# Altium footprint library Miscellaneous THD.PcbLib: 216 footprints (part 1 of 15) (continued)
## APPOINTECH_FD13R0S1STXS-4BX (Preliminary) [mm] "1310nm FP Laser Diode SM Module (Sugar Cube ST Receptacle)"
height 10.28
pads (8):
  round 1.4 hole 0.7: 1(-1.27,3.81) 2(-1.27,1.27) 3(-1.27,-1.27) 4(-1.27,-3.81) 5(1.27,-3.81) 6(1.27,-1.27) 7(1.27,1.27) 8(1.27,3.81)
Top Overlay:
  circle w0.3: c-3.81,5.08 r0.15
  lines w0.2: 7.62,-4.25 8.12,-4.75 ; 7.62,4.25 8.12,4.75 ; 12.62,-3.525 24.72,-3.525 ; 12.62,3.525 24.72,3.525 ; 19.52,-3.525 19.52,-4.1 20.92,-4.1 20.92,-3.525 ; 19.52,3.525 19.52,4.1 20.92,4.1 20.92,3.525 ; 24.72,-0.6 18.52,-0.6 cw(c18.52,0) 18.52,0.6 24.72,0.6 ; 8.12,-4.75 8.62,-4.25 ; 8.12,-4.75 8.12,4.75 ; 8.12,4.75 8.62,4.25 ; 8.62,-4.25 9.12,-4.75 ; 8.62,-4.25 8.62,4.25 ; 8.62,4.25 9.12,4.75 ; 9.12,-4.75 9.62,-4.25 ; 9.12,-4.75 9.12,4.75 ; 9.12,4.75 9.62,4.25 ; 9.62,-4.25 10.12,-4.75 ; 9.62,-4.25 9.62,4.25 ; 9.62,4.25 10.12,4.75 ; 10.12,-4.75 10.62,-4.25 ; 10.12,-4.75 10.12,4.75 ; 10.12,4.75 10.62,4.25 ; 10.62,-4.25 11.12,-4.75 ; 10.62,-4.25 10.62,4.25 ; 10.62,4.25 11.12,4.75 ; 11.12,-4.75 11.62,-4.25 ; 11.12,-4.75 11.12,4.75 ; 11.12,4.75 11.62,4.25 ; 11.62,-4.25 12.12,-4.75 ; 11.62,-4.25 11.62,4.25 ; 11.62,4.25 12.12,4.75 ; 12.12,-4.75 12.62,-4.25 12.62,4.25 12.12,4.75 ; 12.12,-4.75 12.12,4.75 ; 24.72,-3.525 24.72,3.525 ; 24.72,-3.525 24.72,3.525 ; -5.08,-6.35 -5.08,6.35 7.62,6.35 7.62,-6.35 -5.08,-6.35
  text "Preliminary Drawing" at -4.1,-5.9 h1.2
  text "To be approved" at -1.9,-6.5 h1.2
Mechanical 8:
  lines w0.1: -2.27,-3.81 -1.27,-3.81 ; -2.27,-1.27 -1.27,-1.27 ; -2.27,1.27 -1.27,1.27 ; -2.27,3.81 -1.27,3.81 ; -1.27,-4.81 -1.27,-3.81 ; -1.27,-2.81 -1.27,-3.81 ; -1.27,-2.27 -1.27,-1.27 ; -1.27,-0.27 -1.27,-1.27 ; -1.27,0.27 -1.27,1.27 ; -1.27,2.27 -1.27,1.27 ; -1.27,2.81 -1.27,3.81 ; -1.27,4.81 -1.27,3.81 ; -1,0 0,0 ; -0.27,-3.81 -1.27,-3.81 ; -0.27,-1.27 -1.27,-1.27 ; -0.27,1.27 -1.27,1.27 ; -0.27,3.81 -1.27,3.81 ; 0,-1 0,0 ; 0,1 0,0 ; 0.27,-3.81 1.27,-3.81 ; 0.27,-1.27 1.27,-1.27 ; 0.27,1.27 1.27,1.27 ; 0.27,3.81 1.27,3.81 ; 1,0 0,0 ; 1.27,-4.81 1.27,-3.81 ; 1.27,-2.81 1.27,-3.81 ; 1.27,-2.27 1.27,-1.27 ; 1.27,-0.27 1.27,-1.27 ; 1.27,0.27 1.27,1.27 ; 1.27,2.27 1.27,1.27 ; 1.27,2.81 1.27,3.81 ; 1.27,4.81 1.27,3.81 ; 2.27,-3.81 1.27,-3.81 ; 2.27,-1.27 1.27,-1.27 ; 2.27,1.27 1.27,1.27 ; 2.27,3.81 1.27,3.81
Mechanical 14:
  circle w0.3: c-3.81,5.08 r0.15
  lines w0.1: 7.62,-4.25 8.12,-4.75 ; 7.62,4.25 8.12,4.75 ; 12.62,-3.525 24.72,-3.525 24.72,3.525 12.62,3.525 ; 19.52,-3.525 19.52,-4.1 20.92,-4.1 20.92,-3.525 ; 19.52,3.525 19.52,4.1 20.92,4.1 20.92,3.525 ; 24.72,-0.6 18.52,-0.6 cw(c18.52,0) 18.52,0.6 24.72,0.6 ; 8.12,-4.75 8.62,-4.25 ; 8.12,-4.75 8.12,4.75 ; 8.12,4.75 8.62,4.25 ; 8.62,-4.25 9.12,-4.75 ; 8.62,-4.25 8.62,4.25 ; 8.62,4.25 9.12,4.75 ; 9.12,-4.75 9.62,-4.25 ; 9.12,-4.75 9.12,4.75 ; 9.12,4.75 9.62,4.25 ; 9.62,-4.25 10.12,-4.75 ; 9.62,-4.25 9.62,4.25 ; 9.62,4.25 10.12,4.75 ; 10.12,-4.75 10.62,-4.25 ; 10.12,-4.75 10.12,4.75 ; 10.12,4.75 10.62,4.25 ; 10.62,-4.25 11.12,-4.75 ; 10.62,-4.25 10.62,4.25 ; 10.62,4.25 11.12,4.75 ; 11.12,-4.75 11.62,-4.25 ; 11.12,-4.75 11.12,4.75 ; 11.12,4.75 11.62,4.25 ; 11.62,-4.25 12.12,-4.75 ; 11.62,-4.25 11.62,4.25 ; 11.62,4.25 12.12,4.75 ; 12.12,-4.75 12.62,-4.25 12.62,4.25 12.12,4.75 ; 12.12,-4.75 12.12,4.75 ; -5.08,-6.15 ccw(c-4.88,-6.15) -4.88,-6.35 7.42,-6.35 ccw(c7.42,-6.15) 7.62,-6.15 7.62,6.15 ccw(c7.42,6.15) 7.42,6.35 -4.88,6.35 ccw(c-4.88,6.15) -5.08,6.15 -5.08,-6.15
3D body "APPOINTECH_FD13R0S1STXS-4BX.stp": height 10.2, standoff -3.6, extent -5.08,-6.35 24.72,6.35

## ASSMANN_A-31-S1/SILVER [mm] "DIN 41617, Pitch 2.5mm, 31 Contacts Right-Angled Male Connector"
height 8.5
pads (33):
  round 2 hole 1.3: 1(0,0) 2(-2.5,-2.5) 3(0,-5) 4(-2.5,-7.5) 5(0,-10) 6(-2.5,-12.5) 7(0,-15) 8(-2.5,-17.5) 9(0,-20) 10(-2.5,-22.5) 11(0,-25) 12(-2.5,-27.5) 13(0,-30) 14(-2.5,-32.5) 15(0,-35) 16(-2.5,-37.5) 17(0,-40) 18(-2.5,-42.5) 19(0,-45) 20(-2.5,-47.5) 21(0,-50) 22(-2.5,-52.5) 23(0,-55) 24(-2.5,-57.5) 25(0,-60) 26(-2.5,-62.5) 27(0,-65) 28(-2.5,-67.5) 29(0,-70) 30(-2.5,-72.5) 31(0,-75)
  round 3.5 / inner round 3.5 / far side round 5.1 hole 2.8: MTG1(2.5,5) MTG2(2.5,-80)
Top Overlay:
  lines w0.2: 0.916,-77 -1.1,-78.86 ; 2,-76 -1.1,-78.86 ; 2,1 -1.1,3.86 -1.1,7.8 7,7.8 7,-82.8 -1.1,-82.8 -1.1,-78.86 ; 7,-77 2,-77 2,2 7,2
Mechanical 8:
  lines w0.1: -3,-72.5 -2.5,-72.5 ; -3,-67.5 -2.5,-67.5 ; -3,-62.5 -2.5,-62.5 ; -3,-57.5 -2.5,-57.5 ; -3,-52.5 -2.5,-52.5 ; -3,-47.5 -2.5,-47.5 ; -3,-42.5 -2.5,-42.5 ; -3,-37.5 -2.5,-37.5 ; -3,-32.5 -2.5,-32.5 ; -3,-27.5 -2.5,-27.5 ; -3,-22.5 -2.5,-22.5 ; -3,-17.5 -2.5,-17.5 ; -3,-12.5 -2.5,-12.5 ; -3,-7.5 -2.5,-7.5 ; -3,-2.5 -2.5,-2.5 ; -2.5,-73 -2.5,-72.5 ; -2.5,-72 -2.5,-72.5 ; -2.5,-68 -2.5,-67.5 ; -2.5,-67 -2.5,-67.5 ; -2.5,-63 -2.5,-62.5 ; -2.5,-62 -2.5,-62.5 ; -2.5,-58 -2.5,-57.5 ; -2.5,-57 -2.5,-57.5 ; -2.5,-53 -2.5,-52.5 ; -2.5,-52 -2.5,-52.5 ; -2.5,-48 -2.5,-47.5 ; -2.5,-47 -2.5,-47.5 ; -2.5,-43 -2.5,-42.5 ; -2.5,-42 -2.5,-42.5 ; -2.5,-38 -2.5,-37.5 ; -2.5,-37 -2.5,-37.5 ; -2.5,-33 -2.5,-32.5 ; -2.5,-32 -2.5,-32.5 ; -2.5,-28 -2.5,-27.5 ; -2.5,-27 -2.5,-27.5 ; -2.5,-23 -2.5,-22.5 ; -2.5,-22 -2.5,-22.5 ; -2.5,-18 -2.5,-17.5 ; -2.5,-17 -2.5,-17.5 ; -2.5,-13 -2.5,-12.5 ; -2.5,-12 -2.5,-12.5 ; -2.5,-8 -2.5,-7.5 ; -2.5,-7 -2.5,-7.5 ; -2.5,-3 -2.5,-2.5 ; -2.5,-2 -2.5,-2.5 ; -2,-72.5 -2.5,-72.5 ; -2,-67.5 -2.5,-67.5 ; -2,-62.5 -2.5,-62.5 ; -2,-57.5 -2.5,-57.5 ; -2,-52.5 -2.5,-52.5 ; -2,-47.5 -2.5,-47.5 ; -2,-42.5 -2.5,-42.5 ; -2,-37.5 -2.5,-37.5 ; -2,-32.5 -2.5,-32.5 ; -2,-27.5 -2.5,-27.5 ; -2,-22.5 -2.5,-22.5 ; -2,-17.5 -2.5,-17.5 ; -2,-12.5 -2.5,-12.5 ; -2,-7.5 -2.5,-7.5 ; -2,-2.5 -2.5,-2.5 ; -0.5,-75 0,-75 ; -0.5,-70 0,-70 ; -0.5,-65 0,-65 ; -0.5,-60 0,-60 ; -0.5,-55 0,-55 ; -0.5,-50 0,-50 ; -0.5,-45 0,-45 ; -0.5,-40 0,-40 ; -0.5,-35 0,-35 ; -0.5,-30 0,-30 ; -0.5,-25 0,-25 ; -0.5,-20 0,-20 ; -0.5,-15 0,-15 ; -0.5,-10 0,-10 ; -0.5,-5 0,-5 ; -0.5,0 0,0 ; 0,-75.5 0,-75 ; 0,-74.5 0,-75 ; 0,-70.5 0,-70 ; 0,-69.5 0,-70 ; 0,-65.5 0,-65 ; 0,-64.5 0,-65 ; 0,-60.5 0,-60 ; 0,-59.5 0,-60 ; 0,-55.5 0,-55 ; 0,-54.5 0,-55 ; 0,-50.5 0,-50 ; 0,-49.5 0,-50 ; 0,-45.5 0,-45 ; 0,-44.5 0,-45 ; 0,-40.5 0,-40 ; 0,-39.5 0,-40 ; 0,-35.5 0,-35 ; 0,-34.5 0,-35 ; 0,-30.5 0,-30 ; 0,-29.5 0,-30 ; 0,-25.5 0,-25 ; 0,-24.5 0,-25 ; 0,-20.5 0,-20 ; 0,-19.5 0,-20 ; 0,-15.5 0,-15 ; 0,-14.5 0,-15 ; 0,-10.5 0,-10 ; 0,-9.5 0,-10 ; 0,-5.5 0,-5 ; 0,-4.5 0,-5 ; 0,-0.5 0,0 ; 0,0.5 0,0 ; 0.5,-75 0,-75 ; 0.5,-70 0,-70 ; 0.5,-65 0,-65 ; 0.5,-60 0,-60 ; 0.5,-55 0,-55 ; 0.5,-50 0,-50 ; 0.5,-45 0,-45 ; 0.5,-40 0,-40 ; 0.5,-35 0,-35 ; 0.5,-30 0,-30 ; 0.5,-25 0,-25 ; 0.5,-20 0,-20 ; 0.5,-15 0,-15 ; 0.5,-10 0,-10 ; 0.5,-5 0,-5 ; 0.5,0 0,0 ; 2,-80 2.5,-80 ; 2,5 2.5,5 ; 2.5,-80.5 2.5,-80 ; 2.5,-79.5 2.5,-80 ; 2.5,4.5 2.5,5 ; 2.5,5.5 2.5,5 ; 3,-80 2.5,-80 ; 3,5 2.5,5
Mechanical 14:
  lines w0.1: 0.916,-77 -1.1,-78.86 ; 2,-76 -1.1,-78.86 ; 2,1 -1.1,3.86 -1.1,7.8 7,7.8 7,-82.8 -1.1,-82.8 -1.1,-78.86 ; 7,-77 2,-77 2,2 7,2 ; 1.1,-80.775 ccw(c2.5,-80) 3.9,-80.775 3.9,-79.225 ccw(c2.5,-80) 1.1,-79.225 1.1,-80.775 ; 1.1,4.225 ccw(c2.5,5) 3.9,4.225 3.9,5.775 ccw(c2.5,5) 1.1,5.775 1.1,4.225
3D body "ASSMANN_A-31-S1-SILVER.stp": height 8.5, standoff -3.3, extent -3,-82.8 14.2,7.8

## ASSMANN_A-31-S2-SILVER_a [mm] "DIN 41617, Pitch 2.5mm, 31 Solder cups Contacts Right-Angled Female Connector"
height 10
Top Overlay:
  drawing of 230 lines, arcs and shapes, not listed
Mechanical 8:
  lines w0.1: -6.45,-42.5 -4,-42.5 -1.55,-42.5 ; -6.45,42.5 -4,42.5 -1.55,42.5 ; -0.5,0 0,0 ; 0,-0.5 0,0 ; 0,0.5 0,0 ; 0.5,0 0,0
Mechanical 14:
  drawing of 230 lines, arcs and shapes, not listed
3D body "ASSMANN_A-31-S2-SILVER_a.stp": height 9, standoff -1, extent -8,-45.4 5,45.4

## AUGAT_LSG-2FG1-1 [mm] "Single Lead Socket - Wire-Wrap Termination"
height 7.7
pads (1):
  round 1.9 / inner round 1.5 / far side round 1.5 hole 0.9: 1(0,0)
Top Overlay:
  circle w0.2: c0,0 r1.2
Mechanical 14:
  circle w0.1: c0,0 r1.08
Mechanical 15:
  circle w0.05: c0,0 r1.205
3D body "AUGAT_LSG-2FG1-1.stp": height 7.72, standoff -12.93, extent -1.079,-1.079 1.08,1.08

## AVX_10 8478 064 001 025 [mm] "DIN 41612, Type Q, Thru-Hole Press-Fit Terminations; Rows a+b, 64 Position, Performance level 2, Lead 5.3mm, Straight Male Connector"
height 11.48
pads (66):
  round 1.7 hole 1: a1(0,0) a2(0,-2.54) a3(0,-5.08) a4(0,-7.62) a5(0,-10.16) a6(0,-12.7) a7(0,-15.24) a8(0,-17.78) a9(0,-20.32) a10(0,-22.86) a11(0,-25.4) a12(0,-27.94) a13(0,-30.48) a14(0,-33.02) a15(0,-35.56) a16(0,-38.1) a17(0,-40.64) a18(0,-43.18) a19(0,-45.72) a20(0,-48.26) a21(0,-50.8) a22(0,-53.34) a23(0,-55.88) a24(0,-58.42) a25(0,-60.96) a26(0,-63.5) a27(0,-66.04) a28(0,-68.58) a29(0,-71.12) a30(0,-73.66) a31(0,-76.2) a32(0,-78.74) b1(2.54,0) b2(2.54,-2.54) b3(2.54,-5.08) b4(2.54,-7.62) b5(2.54,-10.16) b6(2.54,-12.7) b7(2.54,-15.24) b8(2.54,-17.78) b9(2.54,-20.32) b10(2.54,-22.86) b11(2.54,-25.4) b12(2.54,-27.94) b13(2.54,-30.48) b14(2.54,-33.02) b15(2.54,-35.56) b16(2.54,-38.1) b17(2.54,-40.64) b18(2.54,-43.18) b19(2.54,-45.72) b20(2.54,-48.26) b21(2.54,-50.8) b22(2.54,-53.34) b23(2.54,-55.88) b24(2.54,-58.42) b25(2.54,-60.96) b26(2.54,-63.5) b27(2.54,-66.04) b28(2.54,-68.58) b29(2.54,-71.12) b30(2.54,-73.66) b31(2.54,-76.2) b32(2.54,-78.74)
  round 3.5 / inner round 3.5 / far side round 5.1 hole 2.8: MTG1(2.24,5.63) MTG2(2.24,-84.37)
Top Overlay:
  lines w0.2: -1.83,-83.32 -1.83,-86.87 5.57,-86.87 5.57,8.13 -1.83,8.13 -1.83,4.58 ; -1.83,-81.97 0.576,-81.97 ; -0.81,-86.87 -0.81,-84.37 0.749,-81.67 5.02,-81.67 ; -0.81,8.13 -0.81,5.63 0.749,2.93 5.02,2.93 ; -0.204,-83.32 -3.03,-83.32 -3.03,4.58 -0.204,4.58 ; 0.2,-82.62 -2.48,-82.62 ; 0.2,3.88 -2.48,3.88 ; 1.97,-81.02 4.37,-81.02 4.37,2.28 1.97,2.28 1.97,2.93 ; 2.62,-81.67 1.52,-80.57 ; 2.62,2.93 1.52,1.83 ; 3.731,-81.67 4.684,-83.32 5.57,-83.323 ; 3.731,2.93 4.684,4.58 5.57,4.58 ; -2.48,-82.62 -1.38,-81.52 ; -2.48,-82.62 -2.48,3.88 ; -2.48,3.88 -1.38,2.78 ; -1.38,-81.52 1.52,-81.52 1.52,-80.57 ; -1.38,-81.52 -1.38,2.78 ; -1.38,2.78 1.52,2.78 1.52,1.83 ; 1.52,-80.57 3.92,-80.57 ; 1.52,1.83 3.92,1.83 ; 3.92,-80.57 5.02,-81.67 ; 3.92,-80.57 3.92,1.83 ; 3.92,1.83 5.02,2.93 ; 5.02,-81.67 5.02,2.93
  text "a1" at -5.325,-0.625 h1.2
  text "15" at -5.275,-36.26 h1.2
  text "20" at -5.575,-48.96 h1.2
  text "25" at -5.575,-61.66 h1.2
  text "30" at -5.575,-74.36 h1.2
  text "10" at -5.275,-23.56 h1.2
  text "5" at -4.35,-10.91 h1.2
  text "32" at -5.575,-79.44 h1.2
  text "b" at 5.945,-0.574 h1.2
Mechanical 8:
  drawing of 268 lines, arcs and shapes, not listed
Mechanical 14:
  circle w0.1: c2.24,-84.37 r1.27
  circle w0.1: c2.24,5.63 r1.27
  lines w0.1: -1.83,-83.32 -1.83,-86.87 5.57,-86.87 5.57,8.13 -1.83,8.13 -1.83,4.58 ; -1.83,-81.97 0.576,-81.97 ; -0.81,-86.87 -0.81,-84.37 0.749,-81.67 5.02,-81.67 ; -0.81,8.13 -0.81,5.63 0.749,2.93 5.02,2.93 ; -0.204,-83.32 -3.03,-83.32 -3.03,4.58 -0.204,4.58 ; 0.2,-82.62 -2.48,-82.62 ; 0.2,3.88 -2.48,3.88 ; 1.97,-81.02 4.37,-81.02 4.37,2.28 1.97,2.28 1.97,2.93 ; 2.62,-81.67 1.52,-80.57 ; 2.62,2.93 1.52,1.83 ; 3.731,-81.67 4.684,-83.32 5.57,-83.323 ; 3.731,2.93 4.684,4.58 5.57,4.58 ; -2.48,-82.62 -1.38,-81.52 ; -2.48,-82.62 -2.48,3.88 ; -2.48,3.88 -1.38,2.78 ; -1.38,-81.52 1.52,-81.52 1.52,-80.57 ; -1.38,-81.52 -1.38,2.78 ; -1.38,2.78 1.52,2.78 1.52,1.83 ; 1.52,-80.57 3.92,-80.57 ; 1.52,1.83 3.92,1.83 ; 3.92,-80.57 5.02,-81.67 ; 3.92,-80.57 3.92,1.83 ; 3.92,1.83 5.02,2.93 ; 5.02,-81.67 5.02,2.93
  text "30" at -5.575,-74.36 h1.2
  text "25" at -5.575,-61.66 h1.2
  text "20" at -5.575,-48.96 h1.2
  text "15" at -5.275,-36.26 h1.2
  text "10" at -5.275,-23.56 h1.2
  text "5" at -4.35,-10.91 h1.2
  text "32" at -5.575,-79.44 h1.2
  text "b" at 5.945,-0.574 h1.2
  text "a1" at -5.325,-0.625 h1.2
Drill Drawing:
  lines w0.1: 4.27,-57.71 4.27,-80.17 -1.71,-80.17 -1.71,1.43 4.37,1.43 4.37,-19.61
  text "PRESS-FIT TECHNOLOGY diam. 1mm +0.09 -0.06" at 5.34,-56.3 h1
3D body "AVX_10 8478 064 001 025.stp": height 11.6, standoff -5.3, extent -3.03,-86.87 5.57,8.13

## AVX_20 8478 064 001 025 [mm] "DIN 41612, Type Q, Thru-Hole Press-Fit Terminations; Rows a+b, 64 Position, Performance level 2, Lead 5.3mm, Right Angle Female Connector"
height 8
pads (66):
  round 1.7 hole 1: a1(0,0) a2(0,-2.54) a3(0,-5.08) a4(0,-7.62) a5(0,-10.16) a6(0,-12.7) a7(0,-15.24) a8(0,-17.78) a9(0,-20.32) a10(0,-22.86) a11(0,-25.4) a12(0,-27.94) a13(0,-30.48) a14(0,-33.02) a15(0,-35.56) a16(0,-38.1) a17(0,-40.64) a18(0,-43.18) a19(0,-45.72) a20(0,-48.26) a21(0,-50.8) a22(0,-53.34) a23(0,-55.88) a24(0,-58.42) a25(0,-60.96) a26(0,-63.5) a27(0,-66.04) a28(0,-68.58) a29(0,-71.12) a30(0,-73.66) a31(0,-76.2) a32(0,-78.74) b1(-2.54,0) b2(-2.54,-2.54) b3(-2.54,-5.08) b4(-2.54,-7.62) b5(-2.54,-10.16) b6(-2.54,-12.7) b7(-2.54,-15.24) b8(-2.54,-17.78) b9(-2.54,-20.32) b10(-2.54,-22.86) b11(-2.54,-25.4) b12(-2.54,-27.94) b13(-2.54,-30.48) b14(-2.54,-33.02) b15(-2.54,-35.56) b16(-2.54,-38.1) b17(-2.54,-40.64) b18(-2.54,-43.18) b19(-2.54,-45.72) b20(-2.54,-48.26) b21(-2.54,-50.8) b22(-2.54,-53.34) b23(-2.54,-55.88) b24(-2.54,-58.42) b25(-2.54,-60.96) b26(-2.54,-63.5) b27(-2.54,-66.04) b28(-2.54,-68.58) b29(-2.54,-71.12) b30(-2.54,-73.66) b31(-2.54,-76.2) b32(-2.54,-78.74)
  round 3.5 / inner round 3.5 / far side round 5.1 hole 2.8: MTG1(2.54,5.08) MTG2(2.54,-83.82)
Top Overlay:
  lines w0.2: 0.94,-81.37 0.94,-79.564 ; 0.94,0.824 0.94,2.63 ; 3.955,7.63 5.427,5.08 4.012,2.63 ; 5.59,-86.37 5.59,7.63 ; 5.59,-81.37 -0.06,-81.37 -0.06,-86.37 6.19,-86.37 6.19,7.63 -0.06,7.63 -0.06,2.63 5.59,2.63 ; 6.19,-81.87 12.04,-81.87 ; 6.19,3.13 12.04,3.13 ; 12.04,-81.87 12.04,3.13 ; 12.04,-81.87 12.64,-81.27 12.64,2.53 12.04,3.13
  text "30" at -5.98,-74.285 h1.2
  text "25" at -6,-61.575 h1.2
  text "20" at -6.055,-48.81 h1.2
  text "15" at -5.83,-36.235 h1.2
  text "10" at -5.83,-23.535 h1.2
  text "5" at -4.855,-10.785 h1.2
  text "32" at -5.955,-79.365 h1.2
  text "a" at -0.95,1.99 h1.2
  text "b" at -2.65,2.025 h1.2
  text "1" at -4.505,-0.725 h1.2
Mechanical 8:
  drawing of 266 lines, arcs and shapes, not listed
  text "PCB" at 5.08,-41.275 h1.2
Mechanical 14:
  circle w0.1: c2.54,-83.82 r1.27
  circle w0.1: c2.54,5.08 r1.27
  lines w0.1: 0.94,-81.37 0.94,2.63 ; 0.94,-79.04 -2.84,-79.04 -2.84,-78.44 0.94,-78.44 ; 0.94,-76.5 -2.84,-76.5 -2.84,-75.9 0.94,-75.9 ; 0.94,-73.96 -2.84,-73.96 -2.84,-73.36 0.94,-73.36 ; 0.94,-71.42 -2.84,-71.42 -2.84,-70.82 0.94,-70.82 ; 0.94,-68.88 -2.84,-68.88 -2.84,-68.28 0.94,-68.28 ; 0.94,-66.34 -2.84,-66.34 -2.84,-65.74 0.94,-65.74 ; 0.94,-63.8 -2.84,-63.8 -2.84,-63.2 0.94,-63.2 ; 0.94,-61.26 -2.84,-61.26 -2.84,-60.66 0.94,-60.66 ; 0.94,-58.72 -2.84,-58.72 -2.84,-58.12 0.94,-58.12 ; 0.94,-56.18 -2.84,-56.18 -2.84,-55.58 0.94,-55.58 ; 0.94,-53.64 -2.84,-53.64 -2.84,-53.04 0.94,-53.04 ; 0.94,-51.1 -2.84,-51.1 -2.84,-50.5 0.94,-50.5 ; 0.94,-48.56 -2.84,-48.56 -2.84,-47.96 0.94,-47.96 ; 0.94,-46.02 -2.84,-46.02 -2.84,-45.42 0.94,-45.42 ; 0.94,-43.48 -2.84,-43.48 -2.84,-42.88 0.94,-42.88 ; 0.94,-40.94 -2.84,-40.94 -2.84,-40.34 0.94,-40.34 ; 0.94,-38.4 -2.84,-38.4 -2.84,-37.8 0.94,-37.8 ; 0.94,-35.86 -2.84,-35.86 -2.84,-35.26 0.94,-35.26 ; 0.94,-33.32 -2.84,-33.32 -2.84,-32.72 0.94,-32.72 ; 0.94,-30.78 -2.84,-30.78 -2.84,-30.18 0.94,-30.18 ; 0.94,-28.24 -2.84,-28.24 -2.84,-27.64 0.94,-27.64 ; 0.94,-25.7 -2.84,-25.7 -2.84,-25.1 0.94,-25.1 ; 0.94,-23.16 -2.84,-23.16 -2.84,-22.56 0.94,-22.56 ; 0.94,-20.62 -2.84,-20.62 -2.84,-20.02 0.94,-20.02 ; 0.94,-18.08 -2.84,-18.08 -2.84,-17.48 0.94,-17.48 ; 0.94,-15.54 -2.84,-15.54 -2.84,-14.94 0.94,-14.94 ; 0.94,-13 -2.84,-13 -2.84,-12.4 0.94,-12.4 ; 0.94,-10.46 -2.84,-10.46 -2.84,-9.86 0.94,-9.86 ; 0.94,-7.92 -2.84,-7.92 -2.84,-7.32 0.94,-7.32 ; 0.94,-5.38 -2.84,-5.38 -2.84,-4.78 0.94,-4.78 ; 0.94,-2.84 -2.84,-2.84 -2.84,-2.24 0.94,-2.24 ; 0.94,-0.3 -2.84,-0.3 -2.84,0.3 0.94,0.3 ; 3.955,7.63 5.427,5.08 4.012,2.63 ; 5.59,-86.37 5.59,7.63 ; 5.59,-81.37 -0.06,-81.37 -0.06,-86.37 6.19,-86.37 6.19,7.63 -0.06,7.63 -0.06,2.63 5.59,2.63 ; 6.19,-81.87 12.04,-81.87 ; 6.19,3.13 12.04,3.13 ; 12.04,-81.87 12.04,3.13 ; 12.04,-81.87 12.64,-81.27 12.64,2.53 12.04,3.13
  text "5" at -4.855,-10.785 h1.2
  text "1" at -4.505,-0.725 h1.2
  text "30" at -5.98,-74.285 h1.2
  text "20" at -6.055,-48.81 h1.2
  text "10" at -5.83,-23.535 h1.2
  text "32" at -5.955,-79.365 h1.2
  text "b" at -2.65,2.025 h1.2
  text "a" at -0.95,1.99 h1.2
Drill Drawing:
  lines w0.1: 1.73,-57.71 1.73,-80.17 -4.25,-80.17 -4.25,1.43 1.83,1.43 1.83,-19.61
  text "PRESS-FIT TECHNOLOGY diam. 1mm +0.09 -0.06" at 2.8,-56.3 h1
3D body "AVX_20 8478 064 001 025.stp": height 6.78, standoff -5.3, extent -2.84,-86.37 12.64,7.63

## AXON_ND2A225SCBRPG1 [mm] "AXON Nano-D 2 Row Right Angle PCB Receptacle With Threaded Hole #0-80 UNF"
height 3.82
pads (27):
  round 1 hole 0.4: 1(-3.81,-1.905) 2(-3.175,-0.635) 3(-2.54,-1.905) 4(-1.905,-0.635) 5(-1.27,-1.905) 6(-0.635,-0.635) 7(0,-1.905) 8(0.635,-0.635) 9(1.27,-1.905) 10(1.905,-0.635) 11(2.54,-1.905) 12(3.175,-0.635) 13(3.81,-1.905) 14(-3.493,1.905) 15(-2.858,0.635) 16(-2.222,1.905) 17(-1.587,0.635) 18(-0.953,1.905) 19(-0.318,0.635) 20(0.318,1.905) 21(0.953,0.635) 22(1.587,1.905) 23(2.222,0.635) 24(2.858,1.905) 25(3.493,0.635)
  round 2.7 hole 1.8: 26(5.969,-1.448) 27(-5.968,-1.448)
Top Overlay:
  circle w0.3: c-5.408,0.478 r0.15
  lines w0.2: -7.304,-2.6 -7.304,-8.868 7.306,-8.868 7.306,-2.6 ; -4.704,-3.148 4.701,-3.148 ; -4.699,-0.128 -4.699,2.662 ; 4.701,-0.128 4.701,2.662 ; -4.699,2.662 4.701,2.662 ; -4.699,2.662 4.701,2.662
Mechanical 8:
  circle w0.1: c5.969,-1.448 r0.9
  circle w0.1: c-5.968,-1.448 r0.9
  lines w0.1: -6.468,-1.448 -5.968,-1.448 ; -5.968,-1.948 -5.968,-1.448 ; -5.968,-0.948 -5.968,-1.448 ; -5.468,-1.448 -5.968,-1.448 ; -4.31,-1.905 -3.81,-1.905 ; -3.993,1.905 -3.493,1.905 ; -3.81,-2.405 -3.81,-1.905 ; -3.81,-1.405 -3.81,-1.905 ; -3.675,-0.635 -3.175,-0.635 ; -3.493,1.405 -3.493,1.905 ; -3.493,2.405 -3.493,1.905 ; -3.358,0.635 -2.858,0.635 ; -3.31,-1.905 -3.81,-1.905 ; -3.175,-1.135 -3.175,-0.635 ; -3.175,-0.135 -3.175,-0.635 ; -3.04,-1.905 -2.54,-1.905 ; -2.993,1.905 -3.493,1.905 ; -2.858,0.135 -2.858,0.635 ; -2.858,1.135 -2.858,0.635 ; -2.723,1.905 -2.222,1.905 ; -2.675,-0.635 -3.175,-0.635 ; -2.54,-2.405 -2.54,-1.905 ; -2.54,-1.405 -2.54,-1.905 ; -2.405,-0.635 -1.905,-0.635 ; -2.358,0.635 -2.858,0.635 ; -2.222,1.405 -2.222,1.905 ; -2.222,2.405 -2.222,1.905 ; -2.088,0.635 -1.587,0.635 ; -2.04,-1.905 -2.54,-1.905 ; -1.905,-1.135 -1.905,-0.635 ; -1.905,-0.135 -1.905,-0.635 ; -1.77,-1.905 -1.27,-1.905 ; -1.723,1.905 -2.222,1.905 ; -1.587,0.135 -1.587,0.635 ; -1.587,1.135 -1.587,0.635 ; -1.453,1.905 -0.953,1.905 ; -1.405,-0.635 -1.905,-0.635 ; -1.27,-2.405 -1.27,-1.905 ; -1.27,-1.405 -1.27,-1.905 ; -1.135,-0.635 -0.635,-0.635 ; -1.088,0.635 -1.587,0.635 ; -0.953,1.405 -0.953,1.905 ; -0.953,2.405 -0.953,1.905 ; -0.818,0.635 -0.318,0.635 ; -0.77,-1.905 -1.27,-1.905 ; -0.635,-1.135 -0.635,-0.635 ; -0.635,-0.135 -0.635,-0.635 ; -0.5,-1.905 0,-1.905 ; -0.5,0 0,0 ; -0.453,1.905 -0.953,1.905 ; -0.354,-0.354 0,0 ; -0.354,0.354 0,0 ; -0.318,0.135 -0.318,0.635 ; -0.318,1.135 -0.318,0.635 ; -0.183,1.905 0.318,1.905 ; -0.135,-0.635 -0.635,-0.635 ; 0,-2.405 0,-1.905 ; 0,-1.405 0,-1.905 ; 0,-0.5 0,0 ; 0,0.5 0,0 ; 0.135,-0.635 0.635,-0.635 ; 0.182,0.635 -0.318,0.635 ; 0.318,1.405 0.318,1.905 ; 0.318,2.405 0.318,1.905 ; 0.354,-0.354 0,0 ; 0.354,0.354 0,0 ; 0.453,0.635 0.953,0.635 ; 0.5,-1.905 0,-1.905 ; 0.5,0 0,0 ; 0.635,-1.135 0.635,-0.635 ; 0.635,-0.135 0.635,-0.635 ; 0.77,-1.905 1.27,-1.905 ; 0.818,1.905 0.318,1.905 ; 0.953,0.135 0.953,0.635 ; 0.953,1.135 0.953,0.635 ; 1.088,1.905 1.587,1.905 ; 1.135,-0.635 0.635,-0.635 ; 1.27,-2.405 1.27,-1.905 ; 1.27,-1.405 1.27,-1.905 ; 1.405,-0.635 1.905,-0.635 ; 1.453,0.635 0.953,0.635 ; 1.587,1.405 1.587,1.905 ; 1.587,2.405 1.587,1.905 ; 1.723,0.635 2.222,0.635 ; 1.77,-1.905 1.27,-1.905 ; 1.905,-1.135 1.905,-0.635 ; 1.905,-0.135 1.905,-0.635 ; 2.04,-1.905 2.54,-1.905 ; 2.088,1.905 1.587,1.905 ; 2.222,0.135 2.222,0.635 ; 2.222,1.135 2.222,0.635 ; 2.358,1.905 2.858,1.905 ; 2.405,-0.635 1.905,-0.635 ; 2.54,-2.405 2.54,-1.905 ; 2.54,-1.405 2.54,-1.905 ; 2.675,-0.635 3.175,-0.635 ; 2.723,0.635 2.222,0.635 ; 2.858,1.405 2.858,1.905 ; 2.858,2.405 2.858,1.905 ; 2.993,0.635 3.493,0.635 ; 3.04,-1.905 2.54,-1.905 ; 3.175,-1.135 3.175,-0.635 ; 3.175,-0.135 3.175,-0.635 ; 3.31,-1.905 3.81,-1.905 ; 3.358,1.905 2.858,1.905 ; 3.493,0.135 3.493,0.635 ; 3.493,1.135 3.493,0.635 ; 3.675,-0.635 3.175,-0.635 ; 3.81,-2.405 3.81,-1.905 ; 3.81,-1.405 3.81,-1.905 ; 3.993,0.635 3.493,0.635 ; 4.31,-1.905 3.81,-1.905 ; 5.469,-1.448 5.969,-1.448 ; 5.969,-1.948 5.969,-1.448 ; 5.969,-0.948 5.969,-1.448 ; 6.469,-1.448 5.969,-1.448
Mechanical 14:
  circle w0.1: c5.969,-3.178 r0.175
  circle w0.1: c5.969,-3.178 r0.35
  circle w0.1: c-5.968,-3.178 r0.175
  circle w0.1: c-5.968,-3.178 r0.35
  circle w0.1: c-5.968,-1.448 r0.596
  circle w0.1: c5.969,-1.448 r0.596
  circle w0.3: c-5.408,0.478 r0.15
  lines w0.1: -4.699,-3.148 -4.699,2.662 ; -4.699,-0.128 -7.304,-0.128 -7.304,-8.868 7.306,-8.868 7.306,-0.128 4.701,-0.128 ; 4.706,-3.148 4.701,2.662 ; -4.699,2.662 4.701,2.662 ; -4.699,2.662 -4.704,-3.148 4.701,-3.148 4.701,2.662 ; -4.699,2.662 4.701,2.662
3D body "AXON_ND2A225SCBRPG1.stp": height 3.56, standoff -2.77, extent -7.304,-8.868 7.306,2.662

## BELFUSE_0826-1G1T-43-F [mm] "1 Port, Green/Green LEDs, RJ45 10/100/1000 Gigabit Ethernet, MagJack Connector Module"
height 13.61
pads (20):
  round 1.6 hole 0.9: 1(-5.08,1.27) 2(-3.048,1.27) 3(-1.016,1.27) 4(1.016,1.27) 5(3.048,1.27) 6(5.08,1.27) 7(-6.096,-1.27) 8(-4.064,-1.27) 9(-2.032,-1.27) 10(2.032,-1.27) 11(4.064,-1.27) 12(6.096,-1.27)
  round 1.8 hole 1.1: 13(-6.096,-3.81) 14(-3.556,-3.81) 15(3.556,-3.81) 16(6.096,-3.81)
  round 2.3 hole 1.6: 17(-8.065,19.685) 18(8.065,19.685)
  round 1 hole 3.2 unplated mask+1.1: 19(-6.35,16.51) 20(6.35,16.51)
Top Overlay:
  lines w0.2: -8.924,20.975 cw(c3.316,22.785) -8.15,27.435 ; -8.642,21.124 cw(c3.316,22.785) -8.15,26.565 ; -8.15,15.638 -8.15,-2.765 -7.95,-2.765 ; -8.15,17.382 -8.15,18.137 ; -8.15,21.233 -8.15,27.435 ; -7.325,-4.465 -7.95,-4.465 -7.95,-2.765 ; -7.325,-2.765 -7.95,-2.765 ; -6.826,-5.065 -2.826,-5.065 ; -6.5,27.435 cw(c-6,27.435) -6,27.935 -4.5,27.935 cw(c-4.5,27.435) -4,27.435 ; -6.3,27.435 -6.12,20.222 ccw(c-4.8,20.222) -3.48,20.222 -3.3,27.435 ; -5.8,27.435 -5.619,20.222 ccw(c-4.8,20.222) -3.981,20.201 -3.8,27.435 ; -2.4,-4.465 2.4,-4.465 ; -2.4,-2.765 2.4,-2.765 ; 2.826,-5.065 6.826,-5.065 ; 3.3,27.435 3.48,20.222 ccw(c4.8,20.222) 6.12,20.222 6.3,27.435 ; 3.8,27.435 3.981,20.201 ccw(c4.8,20.222) 5.619,20.222 5.8,27.435 ; 4,27.435 cw(c4.5,27.435) 4.5,27.935 6,27.935 cw(c6,27.435) 6.5,27.435 ; 7.325,-4.465 7.95,-4.465 7.95,-2.765 ; 7.325,-2.765 7.95,-2.765 ; 8.15,15.638 8.15,-2.765 7.95,-2.765 ; 8.15,17.382 8.15,18.137 ; 8.15,21.233 8.15,27.435 ; 8.15,26.565 cw(c-3.316,22.785) 8.642,21.124 ; 8.924,20.975 ccw(c-3.316,22.785) 8.15,27.435 ; -8.15,27.435 8.15,27.435
Mechanical 8:
  circle w0.1: c6.096,-1.27 r0.45
  circle w0.1: c-6.096,-1.27 r0.45
  circle w0.1: c6.096,-3.81 r0.55
  circle w0.1: c-6.096,-3.81 r0.55
  circle w0.1: c-5.08,1.27 r0.45
  circle w0.1: c5.08,1.27 r0.45
  circle w0.1: c6.35,16.51 r1.6
  circle w0.1: c-6.35,16.51 r1.6
  circle w0.1: c-8.065,19.685 r0.8
  circle w0.1: c8.065,19.685 r0.8
  lines w0.1: -8.565,19.685 -8.065,19.685 ; -8.065,19.185 -8.065,19.685 ; -8.065,20.185 -8.065,19.685 ; -7.565,19.685 -8.065,19.685 ; -6.85,16.51 -6.35,16.51 ; -6.596,-3.81 -6.096,-3.81 ; -6.596,-1.27 -6.096,-1.27 ; -6.35,16.01 -6.35,16.51 ; -6.35,17.01 -6.35,16.51 ; -6.096,-4.31 -6.096,-3.81 ; -6.096,-3.31 -6.096,-3.81 ; -6.096,-1.77 -6.096,-1.27 ; -6.096,-0.77 -6.096,-1.27 ; -5.85,16.51 -6.35,16.51 ; -5.596,-3.81 -6.096,-3.81 ; -5.596,-1.27 -6.096,-1.27 ; -5.58,1.27 -5.08,1.27 ; -5.08,0.77 -5.08,1.27 ; -5.08,1.77 -5.08,1.27 ; -4.58,1.27 -5.08,1.27 ; -4.564,-1.27 -4.064,-1.27 ; -4.064,-1.77 -4.064,-1.27 ; -4.064,-0.77 -4.064,-1.27 ; -4.056,-3.81 -3.556,-3.81 ; -3.564,-1.27 -4.064,-1.27 ; -3.556,-4.31 -3.556,-3.81 ; -3.556,-3.31 -3.556,-3.81 ; -3.548,1.27 -3.048,1.27 ; -3.056,-3.81 -3.556,-3.81 ; -3.048,0.77 -3.048,1.27 ; -3.048,1.77 -3.048,1.27 ; -2.548,1.27 -3.048,1.27 ; -2.532,-1.27 -2.032,-1.27 ; -2.032,-1.77 -2.032,-1.27 ; -2.032,-0.77 -2.032,-1.27 ; -1.532,-1.27 -2.032,-1.27 ; -1.516,1.27 -1.016,1.27 ; -1.016,0.77 -1.016,1.27 ; -1.016,1.77 -1.016,1.27 ; -0.516,1.27 -1.016,1.27 ; -0.5,0 0,0 ; 0,-0.5 0,0 ; 0,0.5 0,0 ; 0.5,0 0,0 ; 0.516,1.27 1.016,1.27 ; 1.016,0.77 1.016,1.27 ; 1.016,1.77 1.016,1.27 ; 1.516,1.27 1.016,1.27 ; 1.532,-1.27 2.032,-1.27 ; 2.032,-1.77 2.032,-1.27 ; 2.032,-0.77 2.032,-1.27 ; 2.532,-1.27 2.032,-1.27 ; 2.548,1.27 3.048,1.27 ; 3.048,0.77 3.048,1.27 ; 3.048,1.77 3.048,1.27 ; 3.056,-3.81 3.556,-3.81 ; 3.548,1.27 3.048,1.27 ; 3.556,-4.31 3.556,-3.81 ; 3.556,-3.31 3.556,-3.81 ; 3.564,-1.27 4.064,-1.27 ; 4.056,-3.81 3.556,-3.81 ; 4.064,-1.77 4.064,-1.27 ; 4.064,-0.77 4.064,-1.27 ; 4.564,-1.27 4.064,-1.27 ; 4.58,1.27 5.08,1.27 ; 5.08,0.77 5.08,1.27 ; 5.08,1.77 5.08,1.27 ; 5.58,1.27 5.08,1.27 ; 5.596,-3.81 6.096,-3.81 ; 5.596,-1.27 6.096,-1.27 ; 5.85,16.51 6.35,16.51 ; 6.096,-4.31 6.096,-3.81 ; 6.096,-3.31 6.096,-3.81 ; 6.096,-1.77 6.096,-1.27 ; 6.096,-0.77 6.096,-1.27 ; 6.35,16.01 6.35,16.51 ; 6.35,17.01 6.35,16.51 ; 6.596,-3.81 6.096,-3.81 ; 6.596,-1.27 6.096,-1.27 ; 6.85,16.51 6.35,16.51 ; 7.565,19.685 8.065,19.685 ; 8.065,19.185 8.065,19.685 ; 8.065,20.185 8.065,19.685 ; 8.565,19.685 8.065,19.685
Mechanical 14:
  lines w0.1: -8.15,26.565 ccw(c3.316,22.785) -8.306,19.516 -8.595,19.435 cw(c3.316,22.785) -8.15,27.435 ; -7.95,-2.765 -7.95,-4.465 -6.826,-4.465 ; -6.826,-2.765 -6.826,-5.065 -2.826,-5.065 -2.826,-2.765 ; -6.5,27.435 cw(c-6,27.435) -6,27.935 -4.5,27.935 cw(c-4.5,27.435) -4,27.435 ; -6.3,27.435 -6.12,20.222 ccw(c-4.8,20.222) -3.48,20.222 -3.3,27.435 ; -5.8,27.435 -5.619,20.222 ccw(c-4.8,20.222) -3.981,20.201 -3.8,27.435 ; -2.826,-4.465 2.826,-4.465 ; -2.826,-3.865 2.826,-3.865 ; 2.826,-2.765 2.826,-5.065 6.826,-5.065 6.826,-2.765 ; 3.3,27.435 3.48,20.222 ccw(c4.8,20.222) 6.12,20.222 6.3,27.435 ; 3.8,27.435 3.981,20.201 ccw(c4.8,20.222) 5.619,20.222 5.8,27.435 ; 4,27.435 cw(c4.5,27.435) 4.5,27.935 6,27.935 cw(c6,27.435) 6.5,27.435 ; 6.826,-4.465 7.95,-4.465 7.95,-2.765 ; 8.15,26.565 cw(c-3.316,22.785) 8.306,19.516 8.595,19.435 ccw(c-3.316,22.785) 8.15,27.435 ; -8.15,27.435 8.15,27.435 ; -8.15,27.435 -8.15,-2.765 8.15,-2.765 8.15,27.435
3D body "BELFUSE_0826-1G1T-43-F.stp": height 14.31, standoff -3.68, extent -9.057,-5.065 9.057,27.935